# Altium footprint library General.PCBLIB: 130 footprints (part 7 of 9)
Each footprint in its own frame and in the unit in brackets; x right, y up, seen from the top. Pads: shape width x height; smd on the part's side, far side on the other; paste and mask are expansions set on the pad; w line width, h text height; cw(c..) or ccw(c..) is an arc to the next point about the centre after c.
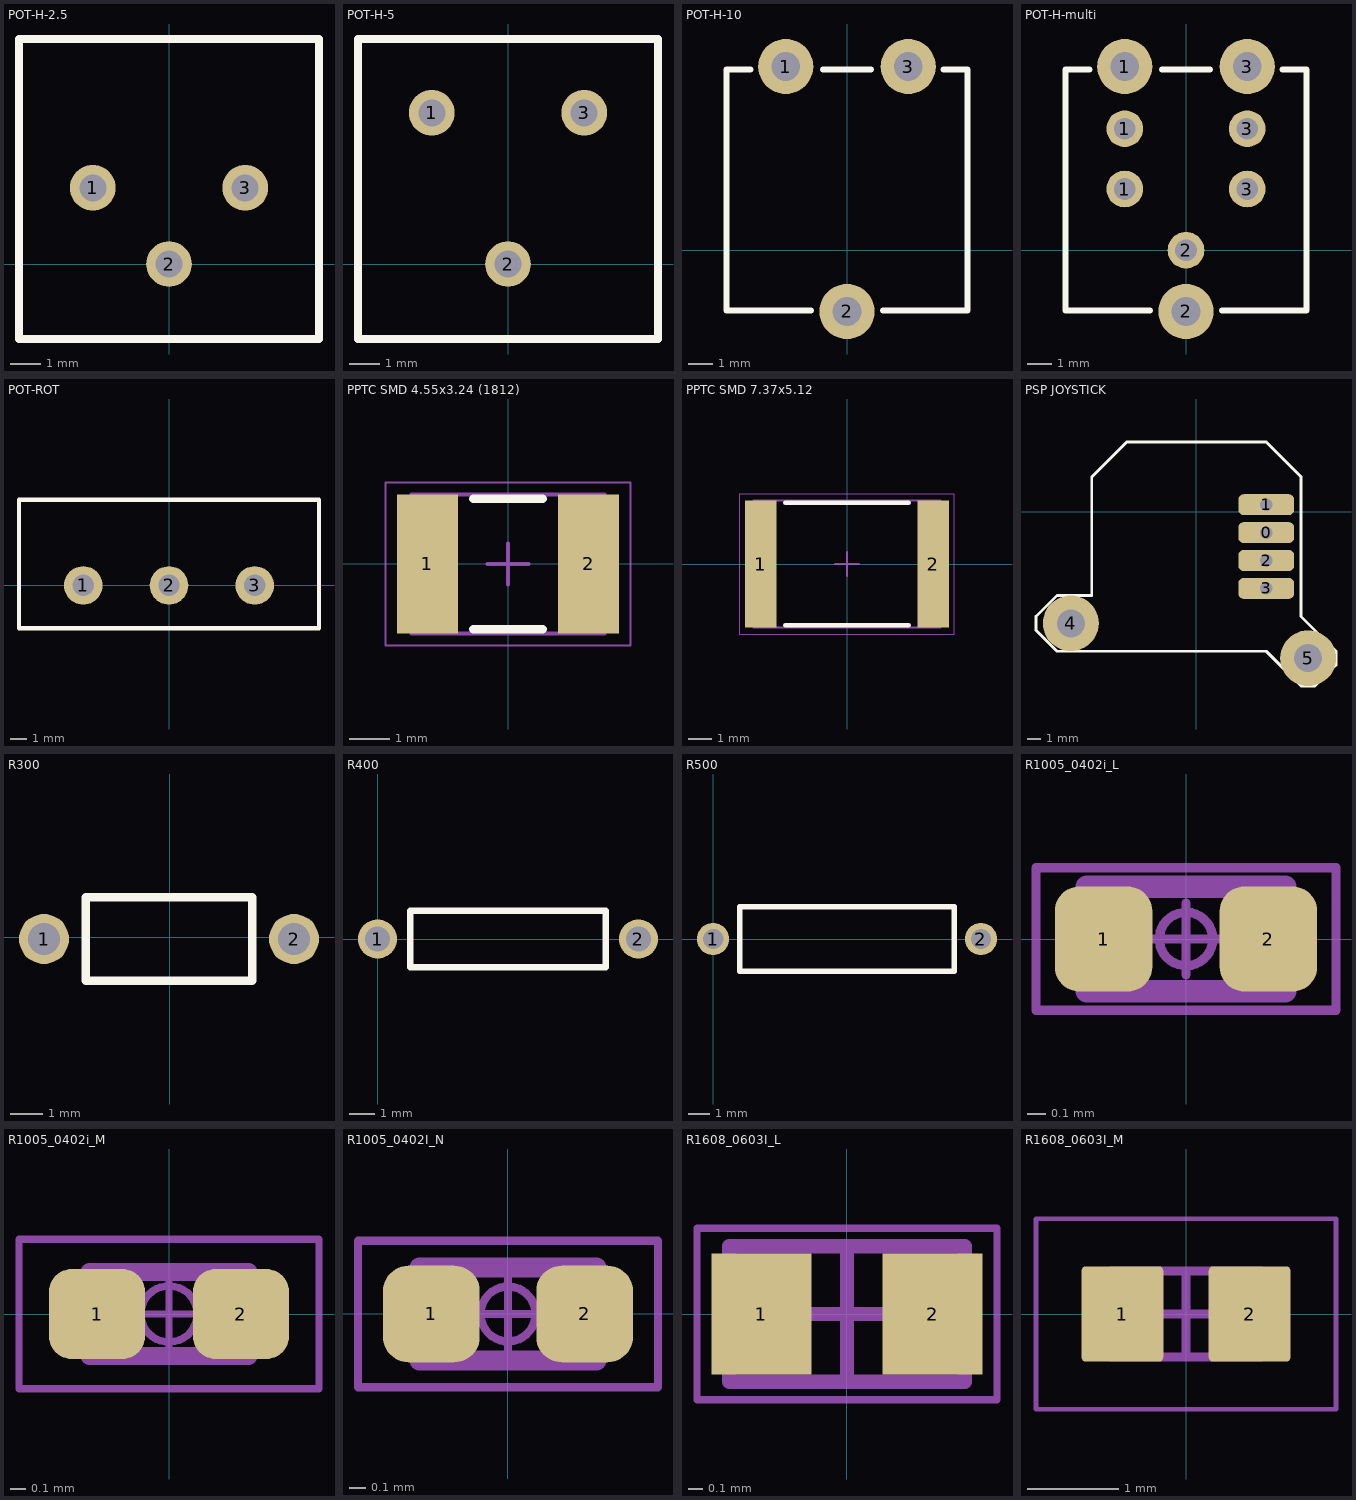
[diagram p6: the footprints below, top view; thin cyan lines are the x and y axes]

## POT-H-2.5 [mil]
pads (3):
  round 60 hole 35.43: 1(-100,100) 2(0,0) 3(100,100)
Top Overlay:
  lines w10: -196.85,-98.43 -196.85,295.28 196.85,295.28 196.85,-98.43 -196.85,-98.43
Top DesignatorDoc:
  text ".Designator" at 0,100 h47.24
3D body "trim_25.stp": height 196.85, standoff -232.15, extent -188.5,-89.56 188.5,287.44

## POT-H-5 [mil]
pads (3):
  round 60 hole 35.43: 1(-100,198.43) 2(0,0) 3(100,198.43)
Top Overlay:
  lines w10: -196.85,-98.43 196.85,-98.43 196.85,295.28 -196.85,295.28 -196.85,-98.43
Top DesignatorDoc:
  text ".Designator" at 0,100 h47.24
3D body "trim_50.stp": height 196.85, standoff -233.15, extent -189.48,-89.12 187.52,287.88

## POT-H-10 [mil]
pads (3):
  round 90 hole 47.24: 1(-100,300) 2(0,-100) 3(100,300)
Top Overlay:
  lines w10: -157.48,295.28 -196.85,295.28 -196.85,-98.43 -59.06,-98.43 ; -39.37,295.28 39.37,295.28 ; 59.06,-98.43 196.85,-98.43 196.85,295.28 157.48,295.28
Top DesignatorDoc:
  text ".Designator" at 0,100 h47.24
3D body "User Library-Trimpot Horizontal.step": height 251.97, standoff -133.86, extent -196.85,-100 196.85,301.58

## POT-H-multi [mil]
pads (8):
  round 60 hole 35.43: 1(-100,100) 1(-100,198.43) 2(0,0) 3(100,100) 3(100,198.43)
  round 90 hole 47.24: 1(-100,300) 2(0,-100) 3(100,300)
Top Overlay:
  lines w10: -157.48,295.28 -196.85,295.28 -196.85,-98.43 -59.06,-98.43 ; -39.37,295.28 39.37,295.28 ; 59.06,-98.43 196.85,-98.43 196.85,295.28 157.48,295.28
Top DesignatorDoc:
  text ".Designator" at 0,100 h47.24
3D body "User Library-Trimpot Horizontal.step": height 251.97, standoff -133.86, extent -197.83,-100.98 195.87,300.6

## POT-ROT [mil]
pads (3):
  round 90 hole 50: 1(-200,0) 2(0,0) 3(200,0)
Top Overlay:
  lines w10: -350,-100 -350,200 350,200 350,-100 -350,-100
Top DesignatorDoc:
  text ".Designator" at 0,75 h47.24
3D body "User Library-Pot.step": height 790.6, standoff -179.4, extent -310,-810.22 310,196

## PPTC SMD 4.55x3.24 (1812) [mm] "PPTC SMD, 2-Leads, Body 4.55x3.24mm, IPC Medium Density"
height 1.3
pads (2):
  rect 1.5x3.4 smd: 1(-1.975,0) 2(1.975,0)
Top Overlay:
  lines w0.2: -0.85,-1.6 0.85,-1.6 ; -0.85,1.6 0.85,1.6
Top Body, 3D Models:
  lines w0.1: -2.365,-1.705 2.365,-1.705 2.365,1.705 -2.365,1.705 -2.365,-1.705
Top Courtyard:
  lines w0.05: -3,-2 3,-2 3,2 -3,2 -3,-2
  lines w0.1: -0.5,0 0.5,0 ; 0,-0.5 0,0.5
Top DesignatorDoc:
  text ".Designator" at 0,0 h1.2
3D body "SW3dPS-1812L.STEP": height 1.34, standoff 0, extent -2.365,-1.705 2.365,1.705

## PPTC SMD 7.37x5.12 [mm] "PPTC SMD, 2-Leads, Body 7.36x5.12mm, IPC Medium Density"
height 1
pads (2):
  rect 1.35x5.45 smd: 1(-3.7,0) 2(3.7,0)
Top Overlay:
  lines w0.2: -2.65,-2.625 2.65,-2.625 ; -2.65,2.625 2.65,2.625
Top Body, 3D Models:
  lines w0.1: -3.99,-2.72 -3.99,2.72 3.99,2.72 3.99,-2.72 -3.99,-2.72
Top Courtyard:
  lines w0.05: -4.6,-3 -4.6,3 4.6,3 4.6,-3 -4.6,-3
  lines w0.1: -0.5,0 0.5,0 ; 0,-0.5 0,0.5
Top DesignatorDoc:
  text ".Designator" at 0,0 h1.2
3D body "User Library-0ZCF0200AF2C.STEP": height 0.81, standoff 0.01, extent -3.99,-2.72 3.99,2.72

## PSP JOYSTICK [mm]
pads (6):
  rrect50% 4x1.5 hole 0.9: 0(5,-1.5) 1(5,0.5) 2(5,-3.5) 3(5,-5.5)
  round 4 hole 2: 4(-9,-8) 5(8,-10.5)
Top Overlay:
  lines w0.2: -11.5,-8.5 -10,-10 5,-10 7.5,-12.5 8.5,-12.5 10,-11 10,-10 7.5,-7.5 7.5,2.5 5,5 -5,5 -7.5,2.5 -7.5,-2.5 -7.5,-4 -7.5,-5 -7.5,-6 -10,-6 -11.5,-7.5 -11.5,-8.5
Top DesignatorDoc:
  text ".Designator" at 0,-3.81 h1.2

## R300 [mil]
pads (2):
  round 60 hole 38: 1(-151,-2) 2(149,-2)
Top Overlay:
  lines w10: -101,-52 99,-52 99,48 -101,48 -101,-52
Top DesignatorDoc:
  text ".Designator" at 0,0 h47.24
3D body "User Library-Resistencia-1.step": height 76.48, standoff -61.76, extent -161,-40.48 159,36

## R400 [mil]
pads (2):
  round 60 hole 38: 1(0,0) 2(400,0)
Top Overlay:
  lines w10: 50,-43.31 50,43.31 350,43.31 350,-43.31 50,-43.31
Top DesignatorDoc:
  text ".Designator" at 200,0 h47.24
3D body "User Library-RESISTOR, 0_25 W, 0_4 IN LEAD PITCH.step": height 91, standoff -124.5, extent -12,-45 412,46

## R500 [mil]
pads (2):
  round 60 hole 38: 1(0,0) 2(500,0)
Top Overlay:
  lines w10: 50,-60 50,60 450,60 450,-60 50,-60
Top DesignatorDoc:
  text ".Designator" at 250,0 h47.24
3D body "User Library-res_05x12_5.STEP": height 125.98, standoff -86.61, extent -8,-62.99 507.75,62.99

## R1005_0402i_L [mm] "Resistor, Chip; 1.00 mm L X 0.50 mm W X 0.40 mm H body"
height 0.4
pads (2):
  rrect50% 0.52x0.56 smd: 1(-0.44,0) 2(0.44,0)
Top Body, 3D Models:
  lines w0.025: -0.5,-0.25 0.5,-0.25 0.5,0.25 -0.5,0.25 -0.5,-0.25
Top Courtyard:
  circle w0.05: c0,0 r0.142
  lines w0.05: -0.19,0 0.19,0 ; 0,-0.19 0,0.19 ; -0.8,-0.38 0.8,-0.38 0.8,0.38 -0.8,0.38 -0.8,-0.38
Top DesignatorDoc:
  text ".Designator" at 0,0 h0.5
Top Pad Outlines:
  lines w0.025: -0.5,-0.25 -0.5,0.25 -0.25,0.25 -0.25,-0.25 -0.5,-0.25 ; 0.25,-0.25 0.5,-0.25 0.5,0.25 0.25,0.25 0.25,-0.25
Top Assembly Outline:
  lines w0.12: -0.53,-0.28 0.53,-0.28 0.53,0.28 -0.53,0.28 -0.53,-0.28
3D body "R1005_0402i_L.STEP": height 0.4, standoff 0, extent -0.5,-0.25 0.5,0.25

## R1005_0402i_M [mm] "Resistor, Chip; 1.00 mm L X 0.50 mm W X 0.40 mm H body"
height 0.4
pads (2):
  rrect50% 0.64x0.6 smd: 1(-0.48,0) 2(0.48,0)
Top Body, 3D Models:
  lines w0.025: -0.5,-0.25 -0.5,0.25 0.5,0.25 0.5,-0.25 -0.5,-0.25
Top Courtyard:
  circle w0.05: c0,0 r0.188
  lines w0.05: -0.25,0 0.25,0 ; 0,-0.25 0,0.25 ; -1,-0.5 -1,0.5 1,0.5 1,-0.5 -1,-0.5
Top DesignatorDoc:
  text ".Designator" at 0,0 h0.5
Top Pad Outlines:
  lines w0.025: -0.5,-0.25 -0.25,-0.25 -0.25,0.25 -0.5,0.25 -0.5,-0.25 ; 0.25,-0.25 0.25,0.25 0.5,0.25 0.5,-0.25 0.25,-0.25
Top Assembly Outline:
  lines w0.12: -0.53,-0.28 -0.53,0.28 0.53,0.28 0.53,-0.28 -0.53,-0.28
3D body "R1005_0402i_M.STEP": height 0.4, standoff 0, extent -0.5,-0.25 0.5,0.25

## R1005_0402I_N [mm] "Resistor, Chip; 1.00 mm L X 0.50 mm W X 0.40 mm H body"
height 0.4
pads (2):
  rrect52% 0.58x0.58 smd: 1(-0.46,0) 2(0.46,0)
Top Body, 3D Models:
  lines w0.025: -0.5,-0.25 -0.5,0.25 0.5,0.25 0.5,-0.25 -0.5,-0.25
Top Courtyard:
  circle w0.05: c0,0 r0.165
  lines w0.05: -0.22,0 0.22,0 ; 0,-0.22 0,0.22 ; -0.9,-0.44 -0.9,0.44 0.9,0.44 0.9,-0.44 -0.9,-0.44
Top DesignatorDoc:
  text ".Designator" at 0,0 h0.5
Top Pad Outlines:
  lines w0.025: -0.5,-0.25 -0.25,-0.25 -0.25,0.25 -0.5,0.25 -0.5,-0.25 ; 0.25,-0.25 0.25,0.25 0.5,0.25 0.5,-0.25 0.25,-0.25
Top Assembly Outline:
  lines w0.12: -0.53,-0.28 -0.53,0.28 0.53,0.28 0.53,-0.28 -0.53,-0.28
3D body "R1005_0402I_N.STEP": height 0.4, standoff 0, extent -0.5,-0.25 0.5,0.25

## R1608_0603I_L [mm] "Chip Resistor, 2-Leads, Body 1.57x0.85mm, IPC High Density"
height 0.5
pads (2):
  rect 0.7x0.85 smd: 1(-0.6,0) 2(0.6,0)
Top Body, 3D Models:
  lines w0.1: -0.825,-0.475 0.825,-0.475 0.825,0.475 -0.825,0.475 -0.825,-0.475
Top Courtyard:
  lines w0.05: -1.05,-0.6 1.05,-0.6 1.05,0.6 -1.05,0.6 -1.05,-0.6
  lines w0.1: -0.475,0 0.475,0 ; 0,-0.475 0,0.475
Top DesignatorDoc:
  text ".Designator" at 0,0 h0.5
3D body "R0603(1608)_L.step": height 0.5, standoff 0, extent -0.825,-0.475 0.825,0.475

## R1608_0603I_M [mm] "Chip Resistor, 2-Leads, Body 1.57x0.85mm, IPC Low Density"
height 0.5
pads (2):
  rrect10% 0.9x1.05 smd: 1(-0.7,0) 2(0.7,0)
Top Body, 3D Models:
  lines w0.1: -0.825,-0.475 0.825,-0.475 0.825,0.475 -0.825,0.475 -0.825,-0.475
Top Courtyard:
  lines w0.05: -1.65,-1.05 1.65,-1.05 1.65,1.05 -1.65,1.05 -1.65,-1.05
  lines w0.1: -0.475,0 0.475,0 ; 0,-0.475 0,0.475
Top DesignatorDoc:
  text ".Designator" at 0,0 h0.5
3D body "R0603(1608)_M.step": height 0.5, standoff 0, extent -0.825,-0.475 0.825,0.475